# Altium footprint library Components.PcbLib: 260 footprints (part 8 of 17)
Each footprint in its own frame and in the unit in brackets; x right, y up, seen from the top. Pads: shape width x height; smd on the part's side, far side on the other; paste and mask are expansions set on the pad; w line width, h text height; cw(c..) or ccw(c..) is an arc to the next point about the centre after c.
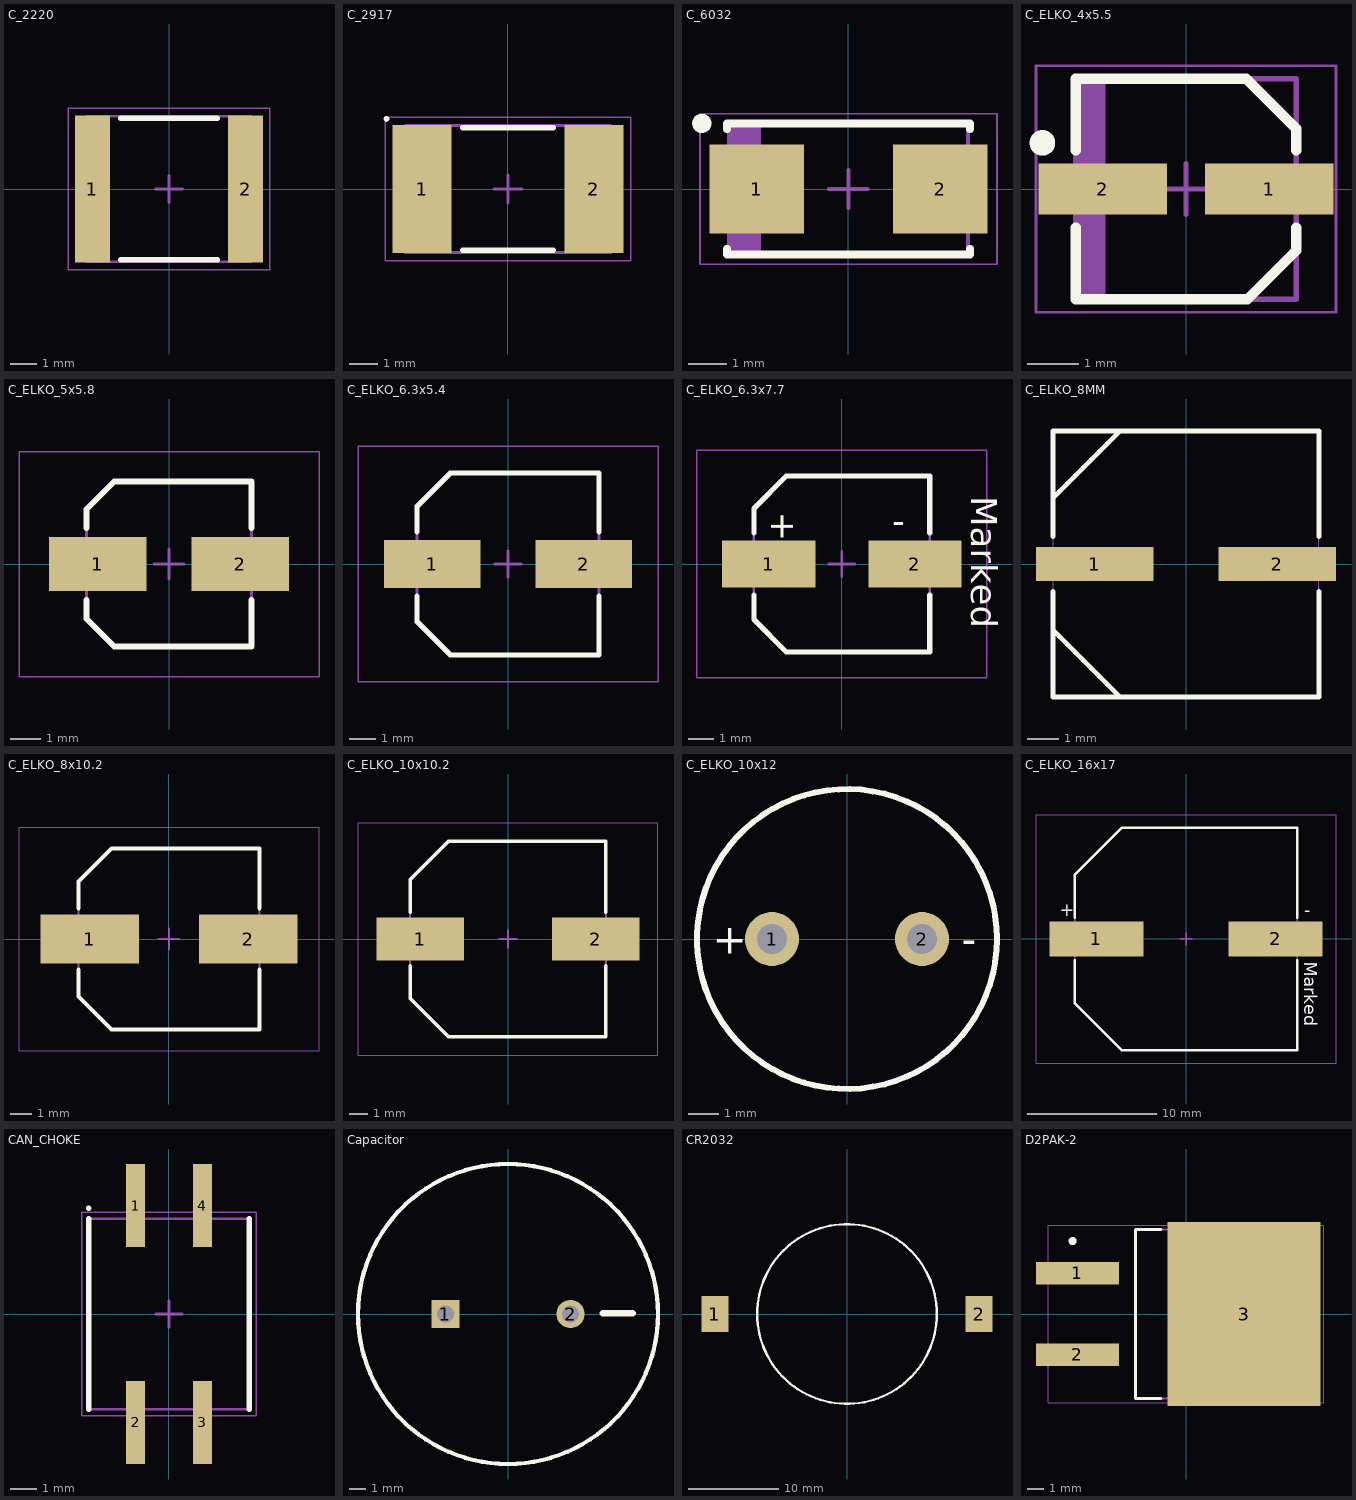
[diagram p7: the footprints below, top view; thin cyan lines are the x and y axes]

## C_2220 [mm] "Chip Capacitor, 2-Leads, Body 5,70x5,00mm, IPC Medium Density"
height 2.3
pads (2):
  rect 1.3x5.45 smd: 1(-2.85,0) 2(2.85,0)
Top Overlay:
  lines w0.2: -1.8,-2.625 1.8,-2.625 ; -1.8,2.625 1.8,2.625
Mechanical 13:
  lines w0.1: -3.05,-2.7 -3.05,2.7 3.05,2.7 3.05,-2.7 -3.05,-2.7
Mechanical 15:
  lines w0.05: -3.75,-3 -3.75,3 3.75,3 3.75,-3 -3.75,-3
  lines w0.1: -0.5,0 0.5,0 ; 0,-0.5 0,0.5
3D body: height 2.3, standoff 0, extent -2.55,-2.7 2.55,2.7
3D body: height 2.3, standoff 0, extent -3.05,-2.7 -2.55,2.7
3D body: height 2.3, standoff 0, extent 2.55,-2.7 3.05,2.7

## C_2917 [mm] "Tantal capacitor \"D\" type:"
height 2.9
pads (2):
  rect 2.1x4.55 smd: 1(-3.05,0) 2(3.05,0)
Top Overlay:
  circle w0.1: c-4.312,2.487 r0.05
  lines w0.2: -1.6,-2.175 1.6,-2.175 ; -1.6,2.175 1.6,2.175
Mechanical 13:
  lines w0.1: -3.65,-2.25 3.65,-2.25 3.65,2.25 -3.65,2.25 -3.65,-2.25
Mechanical 15:
  lines w0.05: -4.35,-2.55 4.35,-2.55 4.35,2.55 -4.35,2.55 -4.35,-2.55
  lines w0.1: -0.5,0 0.5,0 ; 0,-0.5 0,0.5
3D body: height 2.9, standoff 0, extent -3.637,-2.087 3.638,2.088
3D body: height 2.91, standoff 0, extent -3.562,-2.05 -3.237,2.05
3D body: height 1.45, standoff 0, extent -3.675,-1.9 -3.025,1.825
3D body: height 1.45, standoff 0, extent 3.05,-1.85 3.7,1.875

## C_6032 [mm]
height 2.8
pads (2):
  rect 2.45x2.3 smd: 1(-2.375,0) 2(2.375,0)
Top Overlay:
  circle w0.25: c-3.8,1.7 r0.125
  lines w0.2: -3.15,-1.55 -3.15,-1.7 3.15,-1.7 3.15,-1.55 ; -3.15,1.55 -3.15,1.7 3.15,1.7 3.15,1.55
Mechanical 13:
  rectangle: -3.1,-1.7 -2.266,1.7
  lines w0.1: -3.1,-1.7 3.1,-1.7 3.1,1.7 -3.1,1.7 -3.1,-1.7
Mechanical 15:
  lines w0.05: -3.85,-1.95 3.85,-1.95 3.85,1.95 -3.85,1.95 -3.85,-1.95
  lines w0.1: -0.5,0 0.5,0 ; 0,-0.5 0,0.5
3D body "C_6032.step": height 2.8, standoff 0, extent -3.15,-1.75 3.15,1.75

## C_ELKO_4x5.5 [mm]
height 5.7
pads (2):
  rect 2.5x1 smd: 1(1.625,0) 2(-1.625,0)
Top Overlay:
  circle w0.25: c-2.8,0.9 r0.125
  lines w0.2: -2.15,-0.75 -2.15,-2.15 1.2,-2.15 2.15,-1.2 2.15,-0.75 ; -2.15,0.75 -2.15,2.15 1.175,2.15 2.15,1.175 2.15,0.75
Mechanical 13:
  rectangle: -2.15,-2.15 -1.572,2.15
  lines w0.1: -2.15,-2.15 -2.15,2.15 2.15,2.15 2.15,-2.15 -2.15,-2.15
Mechanical 15:
  lines w0.05: -2.925,-2.4 -2.925,2.4 2.925,2.4 2.925,-2.4 -2.925,-2.4
  lines w0.1: -0.5,0 0.5,0 ; 0,-0.5 0,0.5
3D body "C_ELKO_4x5.5.STEP": height 5.4, standoff 0, extent -2.3,-2.15 2.3,2.15

## C_ELKO_5x5.8 [mm]
height 6.1
pads (2):
  rect 3.25x1.8 smd: 1(-2.375,0) 2(2.375,0)
Top Overlay:
  lines w0.2: -2.75,-1.2 -2.75,-1.825 -1.825,-2.75 2.75,-2.75 2.75,-1.2 ; -2.75,1.2 -2.75,1.825 -1.825,2.75 2.75,2.75 2.75,1.2
Mechanical 13:
  lines w0.1: -2.75,-1.825 -2.75,1.825 -1.825,2.75 2.75,2.75 2.75,-2.75 -1.825,-2.75 -2.75,-1.825
Mechanical 15:
  lines w0.05: -5,-3.75 5,-3.75 5,3.75 -5,3.75 -5,-3.75
  lines w0.1: -0.5,0 0.5,0 ; 0,-0.5 0,0.5
3D body: height 6.1, standoff 0, extent -2.75,-2.75 2.75,2.75
3D body: height 2.04, standoff 0, extent -2.75,-2.75 2.75,2.75

## C_ELKO_6.3x5.4 [mm] "Aluminum Electrolytic Capacitor, Body 6,60x6,60x6,10mm, IPC Low Density"
height 6.1
pads (2):
  rect 3.6x1.8 smd: 1(-2.825,0) 2(2.825,0)
Top Overlay:
  lines w0.2: -3.4,-1.2 -3.4,-2.15 -2.15,-3.4 3.4,-3.4 3.4,-1.2 ; -3.4,1.2 -3.4,2.15 -2.15,3.4 3.4,3.4 3.4,1.2
Mechanical 13:
  lines w0.1: -3.4,-2.15 -2.15,-3.4 3.4,-3.4 3.4,3.4 -2.15,3.4 -3.4,2.15 -3.4,-2.15
Mechanical 15:
  lines w0.05: -5.6,-4.4 -5.6,4.4 5.6,4.4 5.6,-4.4 -5.6,-4.4
  lines w0.1: -0.5,0 0.5,0 ; 0,-0.5 0,0.5
3D body: height 2.04, standoff 0, extent -3.4,-3.4 3.4,3.4
3D body: height 6.1, standoff 0, extent -3.4,-3.4 3.4,3.398

## C_ELKO_6.3x7.7 [mm] "Aluminum Electrolytic Capacitor, Body 6,60x6,60x8,0mm, IPC Low Density"
height 8
pads (2):
  rect 3.6x1.8 smd: 1(-2.825,0) 2(2.825,0)
Top Overlay:
  lines w0.2: -3.4,-1.2 -3.4,-2.15 -2.15,-3.4 3.4,-3.4 3.4,-1.2 ; -3.4,1.2 -3.4,2.15 -2.15,3.4 3.4,3.4 3.4,1.2
  text "Marked" at 5,2.625 h1
  text "+" at -2.725,2.025 h1
  text "-" at 1.95,1.175 h1
Mechanical 13:
  lines w0.1: -3.4,-2.15 -3.4,2.15 -2.15,3.4 3.4,3.4 3.4,-3.4 -2.15,-3.4 -3.4,-2.15
Mechanical 15:
  lines w0.05: -5.6,-4.4 5.6,-4.4 5.6,4.4 -5.6,4.4 -5.6,-4.4
  lines w0.1: -0.5,0 0.5,0 ; 0,-0.5 0,0.5
3D body: height 8, standoff 0, extent -3.373,-3.394 3.4,3.392
3D body: height 0.3, standoff 0, extent -3.4,-3.4 3.4,3.4
3D body: height 8.01, standoff 1, extent 2.137,-1.6 2.412,1.6

## C_ELKO_8MM [mil]
height 413
pads (2):
  rect 148x43 smd: 1(-115,0) 2(115,0)
Top Overlay:
  lines w6: -167.5,-83.75 -83.75,-167.5 ; -167.5,-34.6 -167.5,-167.5 167.5,-167.5 167.5,-34.6 ; -167.5,34.6 -167.5,167.5 167.5,167.5 167.5,34.6 ; -167.5,83.75 -83.75,167.5
Mechanical 13:
  lines w0: -167.5,-83.75 -83.75,-167.5 ; -167.5,83.75 -83.75,167.5 ; -167.5,-167.5 -167.5,167.5 167.5,167.5 167.5,-167.5 -167.5,-167.5
3D body "SM_RADIAL_8MM.stp": height 275.59, standoff 0, extent -164.39,-162.77 162.39,164

## C_ELKO_8x10.2 [mm]
height 10.5
pads (2):
  rect 4.65x2.3 smd: 1(-3.725,0) 2(3.725,0)
Top Overlay:
  lines w0.2: -4.25,-1.45 -4.25,-2.7 -2.7,-4.25 4.25,-4.25 4.25,-1.45 ; -4.25,1.45 -4.25,2.7 -2.7,4.25 4.25,4.25 4.25,1.45
Mechanical 13:
  lines w0.1: -4.25,-2.7 -2.7,-4.25 4.25,-4.25 4.25,4.25 -2.7,4.25 -4.25,2.7 -4.25,-2.7
Mechanical 15:
  lines w0.05: -7.05,-5.25 -7.05,5.25 7.05,5.25 7.05,-5.25 -7.05,-5.25
  lines w0.1: -0.5,0 0.5,0 ; 0,-0.5 0,0.5
3D body: height 3.5, standoff 0, extent -4.25,-4.25 4.25,4.25
3D body: height 10.5, standoff 0, extent -4.25,-4.25 4.25,4.247

## C_ELKO_10x10.2 [mm]
height 10.5
pads (2):
  rect 4.7x2.3 smd: 1(-4.7,0) 2(4.7,0)
Top Overlay:
  lines w0.2: -5.25,-1.45 -5.25,-3.2 -3.2,-5.25 5.25,-5.25 5.25,-1.45 ; -5.25,1.45 -5.25,3.2 -3.2,5.25 5.25,5.25 5.25,1.45
Mechanical 13:
  lines w0.1: -5.25,-3.2 -3.2,-5.25 5.25,-5.25 5.25,5.25 -3.2,5.25 -5.25,3.2 -5.25,-3.2
Mechanical 15:
  lines w0.05: -8.05,-6.25 -8.05,6.25 8.05,6.25 8.05,-6.25 -8.05,-6.25
  lines w0.1: -0.5,0 0.5,0 ; 0,-0.5 0,0.5
3D body: height 3.5, standoff 0, extent -5.25,-5.25 5.25,5.25
3D body: height 10.5, standoff 0, extent -5.25,-5.25 5.25,5.247

## C_ELKO_10x12 [mm]
height 12
pads (2):
  round 1.8 hole 1: 1(-2.5,0) 2(2.5,0)
Top Overlay:
  circle w0.2: c0,0 r5
  text "+" at -4.475,-0.5 h1
  text "-" at 3.825,-0.5 h1
3D body: height 6, standoff 0, extent -4.961,-4.99 5,4.99

## C_ELKO_16x17 [mm] "Aluminum Electrolytic Capacitor, Body 17,00x17,00x17,00mm, IPC Low Density"
height 17
pads (2):
  rect 7.3x2.7 smd: 1(-6.925,0) 2(6.925,0)
Top Overlay:
  lines w0.2: -8.6,-1.65 -8.6,-4.975 -4.975,-8.6 8.6,-8.6 8.6,-1.65 ; -8.6,1.65 -8.6,4.975 -4.975,8.6 8.6,8.6 8.6,1.65
  text "Marked" at 9.144,-1.778 h1
  text "+" at -9.779,1.778 h1
  text "-" at 9.144,1.778 h1
Mechanical 13:
  lines w0.1: -8.6,-4.975 -4.975,-8.6 8.6,-8.6 8.6,8.6 -4.975,8.6 -8.6,4.975 -8.6,-4.975
Mechanical 15:
  lines w0.05: -11.6,-9.6 -11.6,9.6 11.6,9.6 11.6,-9.6 -11.6,-9.6
  lines w0.1: -0.5,0 0.5,0 ; 0,-0.5 0,0.5
3D body: height 1, standoff 0, extent -8.6,-8.6 8.6,8.6
3D body: height 16.5, standoff 0, extent -7.937,-7.987 8,7.981
3D body: height 16.51, standoff 0, extent 3.81,-3.302 5.588,3.429

## CAN_CHOKE [mm] "DFN, 4-Leads, Body 7,00x5,95mm, Pitch 2,50mm, IPC Medium Density"
height 5.2
pads (4):
  rect 0.7x3.1 smd: 1(-1.25,4.05) 2(-1.25,-4.05) 3(1.25,-4.05) 4(1.25,4.05)
Top Overlay:
  circle w0.1: c-3,3.95 r0.05
  lines w0.2: -3,-3.55 -3,3.55 ; 3,-3.55 3,3.55
Mechanical 13:
  lines w0.1: -3,-3.55 -3,3.55 3,3.55 3,-3.55 -3,-3.55
Mechanical 15:
  lines w0.05: -3.25,-3.8 -3.25,3.8 3.25,3.8 3.25,-3.8 -3.25,-3.8
  lines w0.1: -0.5,0 0.5,0 ; 0,-0.5 0,0.5
3D body "B82790-S513-N201.step": height 5.15, standoff 0, extent -3,-4.5 3,4.5

## Capacitor [mm] "R 18x35"
pads (2):
  rect 1.7x1.7 hole 1: 1(-3.75,0)
  round 1.7 hole 1: 2(3.75,0)
Top Overlay:
  circle w0.254: c0,0 r9
  lines w0.4: 5.675,0.05 7.475,0.05
3D body "User Library-cap-3.step": height 35.05, standoff -3.6, extent -10.424,-10.425 10.476,10.426

## CR2032 [mm]
pads (2):
  rect 3x4 smd: 1(-14.7,0) 2(14.7,0)
Top Overlay:
  circle w0.254: c0,0 r10
3D body "CR2032.STEP": height 5.3, standoff 0, extent -16,-10.007 16,10.008

## D2PAK-2 [mm]
height 4.8
pads (3):
  rect 5.15x1.4 smd: 1(-6.75,2.54) 2(-6.75,-2.54)
  rect 9.5x11.43 smd: 3(3.6,0)
Top Overlay:
  circle w0.25: c-7.05,4.525 r0.125
  lines w0.2: -1.55,-5.25 -3.15,-5.25 -3.15,5.25 -1.55,5.25
Mechanical 13:
  lines w0.1: -3.15,-5.25 6.5,-5.25 6.5,5.25 -3.15,5.25 -3.15,-5.25
Mechanical 15:
  lines w0.05: -8.55,-5.5 8.55,-5.5 8.55,5.5 -8.55,5.5 -8.55,-5.5
  lines w0.1: -0.5,0 0.5,0 ; 0,-0.5 0,0.5
3D body "D2PAK.step": height 4.92, standoff -0.09, extent -7.765,-5.08 7.499,5.08